# Altium footprint library Sajad_Altium_Library.PcbLib: 380 footprints (part 21 of 24)
Each footprint in its own frame and in the unit in brackets; x right, y up, seen from the top. Pads: shape width x height; smd on the part's side, far side on the other; paste and mask are expansions set on the pad; w line width, h text height; cw(c..) or ccw(c..) is an arc to the next point about the centre after c.
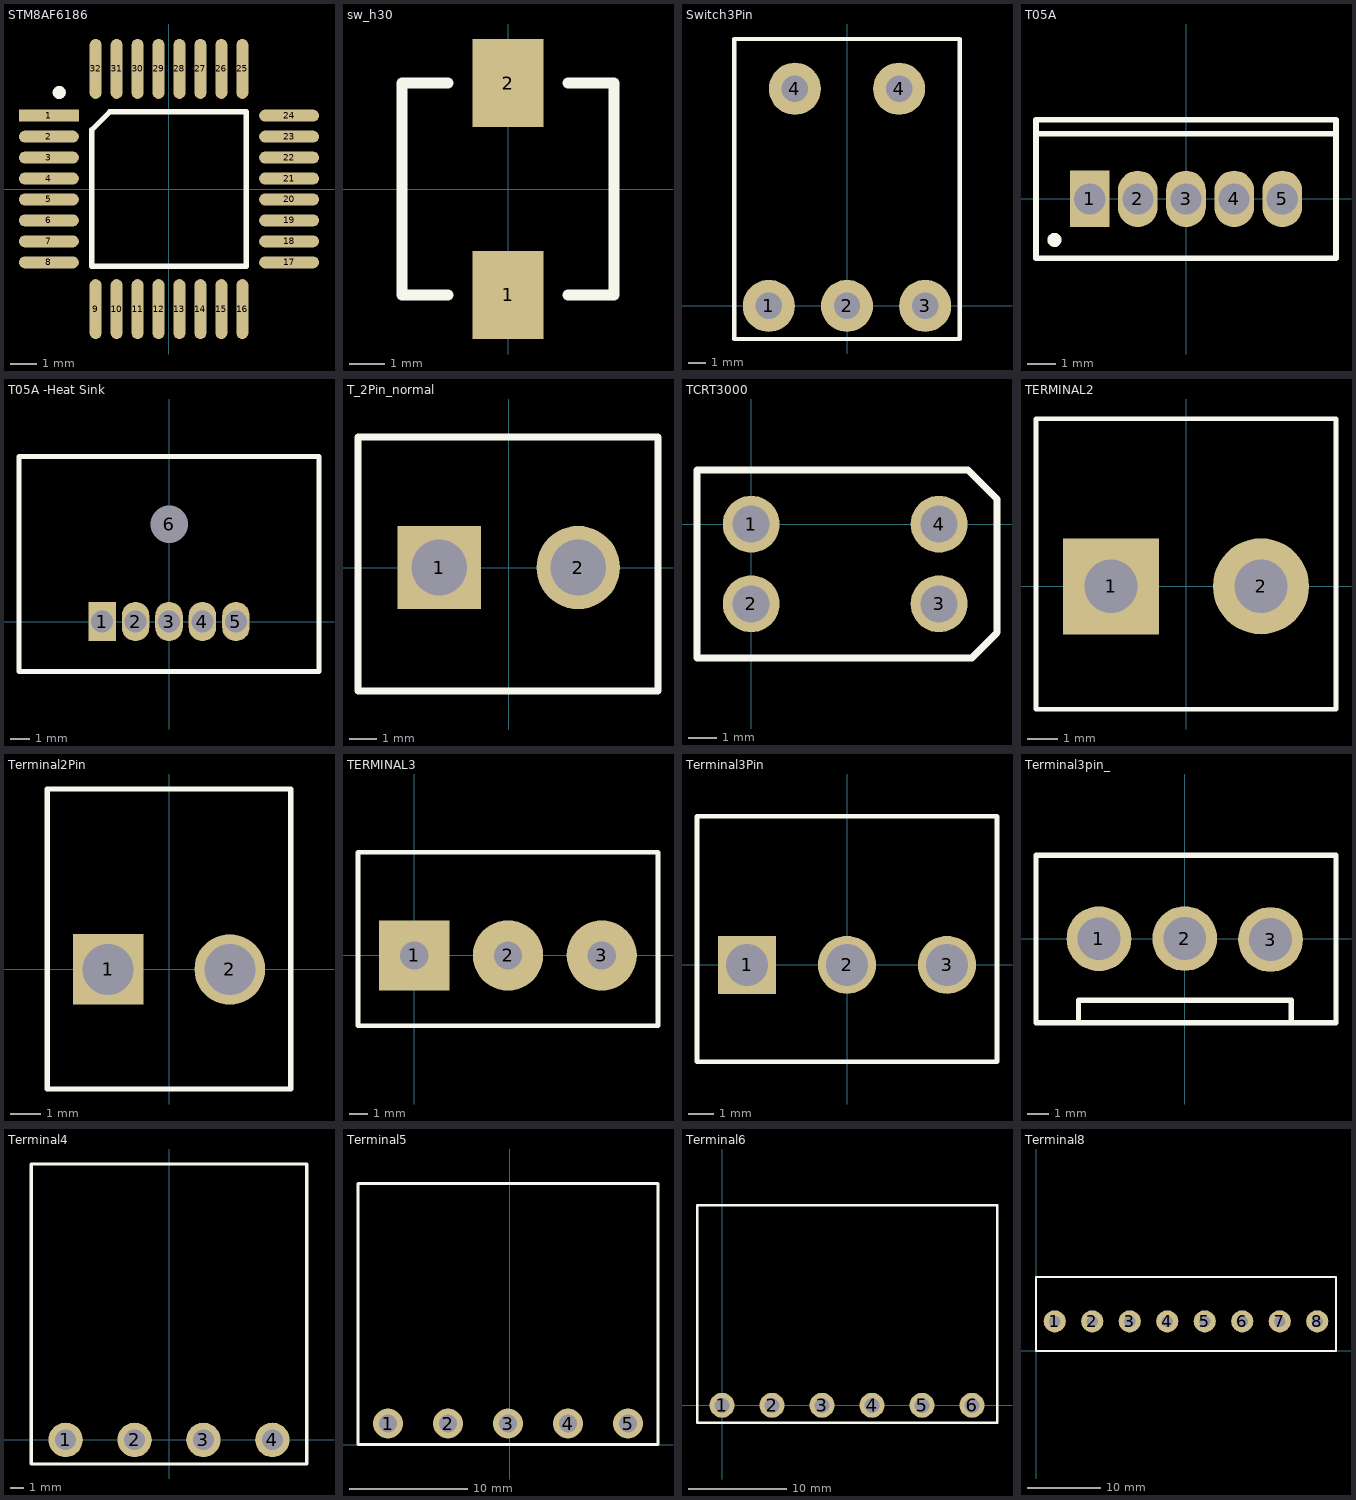
[diagram p20: the footprints below, top view; thin cyan lines are the x and y axes]

## STM8AF6186 [mil] "STM8AF6186"
pads (32):
  rect 90x18 smd: 1(-180.35,110.24)
  oval 90x18 smd: 2(-180.35,78.74) 3(-180.35,47.24) 4(-180.35,15.75) 5(-180.35,-15.75) 6(-180.35,-47.24) 7(-180.35,-78.74) 8(-180.35,-110.24) 17(180.35,-110.24) 18(180.35,-78.74) 19(180.35,-47.24) 20(180.35,-15.75) 21(180.35,15.75) 22(180.35,47.24) 23(180.35,78.74) 24(180.35,110.24)
  oval 18x90 smd: 9(-110.24,-180.35) 10(-78.74,-180.35) 11(-47.24,-180.35) 12(-15.75,-180.35) 13(15.75,-180.35) 14(47.24,-180.35) 15(78.74,-180.35) 16(110.24,-180.35) 25(110.24,180.35) 26(78.74,180.35) 27(47.24,180.35) 28(15.75,180.35) 29(-15.75,180.35) 30(-47.24,180.35) 31(-78.74,180.35) 32(-110.24,180.35)
Top Overlay:
  circle w9.84: c-164.92,145 r4.92
  lines w7.87: -116.14,-116.14 -116.14,88.86 -88.86,116.14 116.14,116.14 116.14,-116.14 -116.14,-116.14
3D body: height 56.47, standoff -1.35, extent -178.72,-178.72 178.72,178.72

## sw_h30 [mm]
pads (2):
  rect 2x2.5 smd: 1(0,-3) 2(0,3)
Top Overlay:
  lines w0.305: -1.7,-3 -3,-3 -3,3 -1.7,3 ; 1.699,3 2.999,3 ; 1.7,-3 3,-3 3,3

## Switch3Pin [mm]
pads (5):
  round 3 hole 1.524: 1(-4.5,0) 2(0,0) 3(4.5,0) 4(-3,12.5) 4(3,12.5)
Top Overlay:
  lines w0.254: -6.5,-1.905 6.5,-1.905 6.5,15.367 -6.5,15.367 -6.5,-1.905

## T05A [mm] "TO, Thru-Hole, Vertical, Heatsink Mounted; 5 In-Line Leads; Pitch 1.70 mm"
height 19.6
pads (5):
  rect 1.4x2 hole 1.1: 1(-3.4,0)
  oval 1.4x2 hole 1.1: 2(-1.7,0) 3(0,0) 4(1.7,0) 5(3.4,0)
Top Overlay:
  circle w0.25: c-4.65,-1.45 r0.125
  lines w0.2: -5.3,2.3 5.3,2.3 ; -5.3,-2.1 5.3,-2.1 5.3,2.8 -5.3,2.8 -5.3,-2.1
Mechanical 13:
  lines w0.1: -5.3,2.3 5.3,2.3 ; -5.3,-2.1 -5.3,2.8 5.3,2.8 5.3,-2.1 -5.3,-2.1 ; -3.91,-0.28 -3.91,0.28 -2.89,0.28 -2.89,-0.28 -3.91,-0.28 ; -2.21,-0.28 -2.21,0.28 -1.19,0.28 -1.19,-0.28 -2.21,-0.28 ; -0.51,-0.28 -0.51,0.28 0.51,0.28 0.51,-0.28 -0.51,-0.28 ; 1.19,-0.28 1.19,0.28 2.21,0.28 2.21,-0.28 1.19,-0.28 ; 2.89,-0.28 2.89,0.28 3.91,0.28 3.91,-0.28 2.89,-0.28
Mechanical 15:
  lines w0.1: -0.5,0 0.5,0 ; 0,-0.5 0,0.5
3D body: height 17, standoff -10.82, extent -5.08,-2.359 5.08,2.591

## T05A -Heat Sink [mm] "TO, Thru-Hole, Vertical, Heatsink Mounted; 5 In-Line Leads; Pitch 1.70 mm"
height 19.6
pads (6):
  rect 1.4x2 hole 1.1: 1(-3.4,0)
  oval 1.4x2 hole 1.1: 2(-1.7,0) 3(0,0) 4(1.7,0) 5(3.4,0)
  round 1.778 hole 1.905: 6(0,4.953)
Top Overlay:
  lines w0.254: -7.62,-2.54 -4.953,-2.54 4.826,-2.54 7.62,-2.54 7.62,8.382 -7.62,8.382 -7.62,4.953 -7.62,-2.54
Mechanical 13:
  lines w0.1: -3.91,-0.28 -2.89,-0.28 -2.89,0.28 -3.91,0.28 -3.91,-0.28 ; -2.21,-0.28 -1.19,-0.28 -1.19,0.28 -2.21,0.28 -2.21,-0.28 ; -0.51,-0.28 0.51,-0.28 0.51,0.28 -0.51,0.28 -0.51,-0.28 ; 1.19,-0.28 2.21,-0.28 2.21,0.28 1.19,0.28 1.19,-0.28 ; 2.89,-0.28 3.91,-0.28 3.91,0.28 2.89,0.28 2.89,-0.28
Mechanical 15:
  lines w0.1: -0.5,0 0.5,0 ; 0,-0.5 0,0.5
3D body: height 25, standoff -3.8, extent -7.391,-2.48 7.391,8.322
3D body: height 20.8, standoff -7.98, extent -4.95,-2.159 4.95,2.341

## T_2Pin_normal [mm]
height 0.55
pads (2):
  rect 3x3 hole 2: 1(-2.5,0)
  round 3 hole 2: 2(2.5,0)
Top Overlay:
  lines w0.25: -5.421,-4.445 -5.421,4.699 5.374,4.699 5.374,-4.445 -5.421,-4.445

## TCRT3000 [mm]
height 0.55
pads (4):
  round 2 hole 1.3: 1(0,0) 2(0,-2.794) 3(6.604,-2.794) 4(6.604,0)
Top Overlay:
  lines w0.25: -1.905,-4.699 -1.905,1.905 7.62,1.905 8.636,0.889 8.636,-3.81 7.747,-4.699 -1.905,-4.699

## TERMINAL2 [mm]
pads (2):
  rect 3.2x3.2 hole 1.778: 1(-2.5,0)
  round 3.2 hole 1.778: 2(2.5,0)
Top Overlay:
  lines w0.152: -5,-4.1 -5,5.588 5,5.588 5,-4.1 -5,-4.1
3D body: height 10, standoff -4.16, extent -5.427,-3.429 5.173,4.171

## Terminal2Pin [mil]
pads (2):
  rect 90x90 hole 65: 1(-77.5,0)
  round 90 hole 65: 2(77.5,0)
Top Overlay:
  lines w7: -155,-152.5 155,-152.5 155,230 -155,230 -155,-152.5
3D body: height 334.65, standoff -137.8, extent -147.64,-148.4 147.64,139

## TERMINAL3 [mil]
pads (3):
  rect 150x150 hole 60: 1(0,0)
  round 150 hole 60: 2(200,0) 3(400,0)
Top Overlay:
  lines w10: -120,-150 520,-150 520,220 -120,220 -120,-150

## Terminal3Pin [mil]
pads (3):
  rect 90x90 hole 65: 1(-155,0)
  round 90 hole 65: 2(0,0) 3(155,0)
Top Overlay:
  lines w7: -232.5,-150 -232.5,230 232.5,230 232.5,-150 -232.5,-150
3D body: height 334.65, standoff -137.8, extent -147.64,-148.4 147.64,139

## Terminal3pin_ [mm]
pads (3):
  round 3.02 hole 2: 1(-4,-0.006) 2(0,0) 3(4,-0.044)
Top Overlay:
  lines w0.254: -4.953,-3.931 -4.953,-2.864 4.966,-2.864 4.953,-3.931 ; -6.934,-3.931 7.036,-3.931 7.048,-3.918 7.048,3.893 -6.934,3.893 -6.934,-3.931

## Terminal4 [mil] "Terminal 4 pin"
pads (4):
  round 100 hole 60: 1(-300,0) 2(-100,0) 3(100,0) 4(300,0)
Top Overlay:
  lines w10: -400,-70 -400,800 400,800 400,-70 -400,-70
3D body: height 332.68, standoff -165.35, extent -439.37,0 439.37,472.44

## Terminal5 [mil] "Terminal 5 pin"
pads (5):
  round 100 hole 60: 1(-405,70) 2(-205,70) 3(-5,70) 4(195,70) 5(395,70)
Top Overlay:
  lines w10: -505,0 495,0 495,870 -505,870 -505,0

## Terminal6 [mil] "Terminal 6 pin"
pads (6):
  round 100 hole 60: 1(0,0) 2(200,0) 3(400,0) 4(600,0) 5(800,0) 6(1000,0)
Top Overlay:
  lines w10: -100,-70 -100,800 900,800 1100,800 1100,-70 900,-70 -100,-70

## Terminal8 [mm] "Terminal 8 pin"
pads (8):
  round 3 hole 1.524: 1(2.54,4) 2(7.62,4) 3(12.7,4) 4(17.78,4) 5(22.86,4) 6(27.94,4) 7(33.02,4) 8(38.1,4)
Top Overlay:
  lines w0.254: 0,0 40.64,0 40.64,10 0,10 0,0